# Altium footprint library CADTchip.PcbLib: 195 footprints (part 5 of 13)
Each footprint in its own frame and in the unit in brackets; x right, y up, seen from the top. Pads: shape width x height; smd on the part's side, far side on the other; paste and mask are expansions set on the pad; w line width, h text height; cw(c..) or ccw(c..) is an arc to the next point about the centre after c.
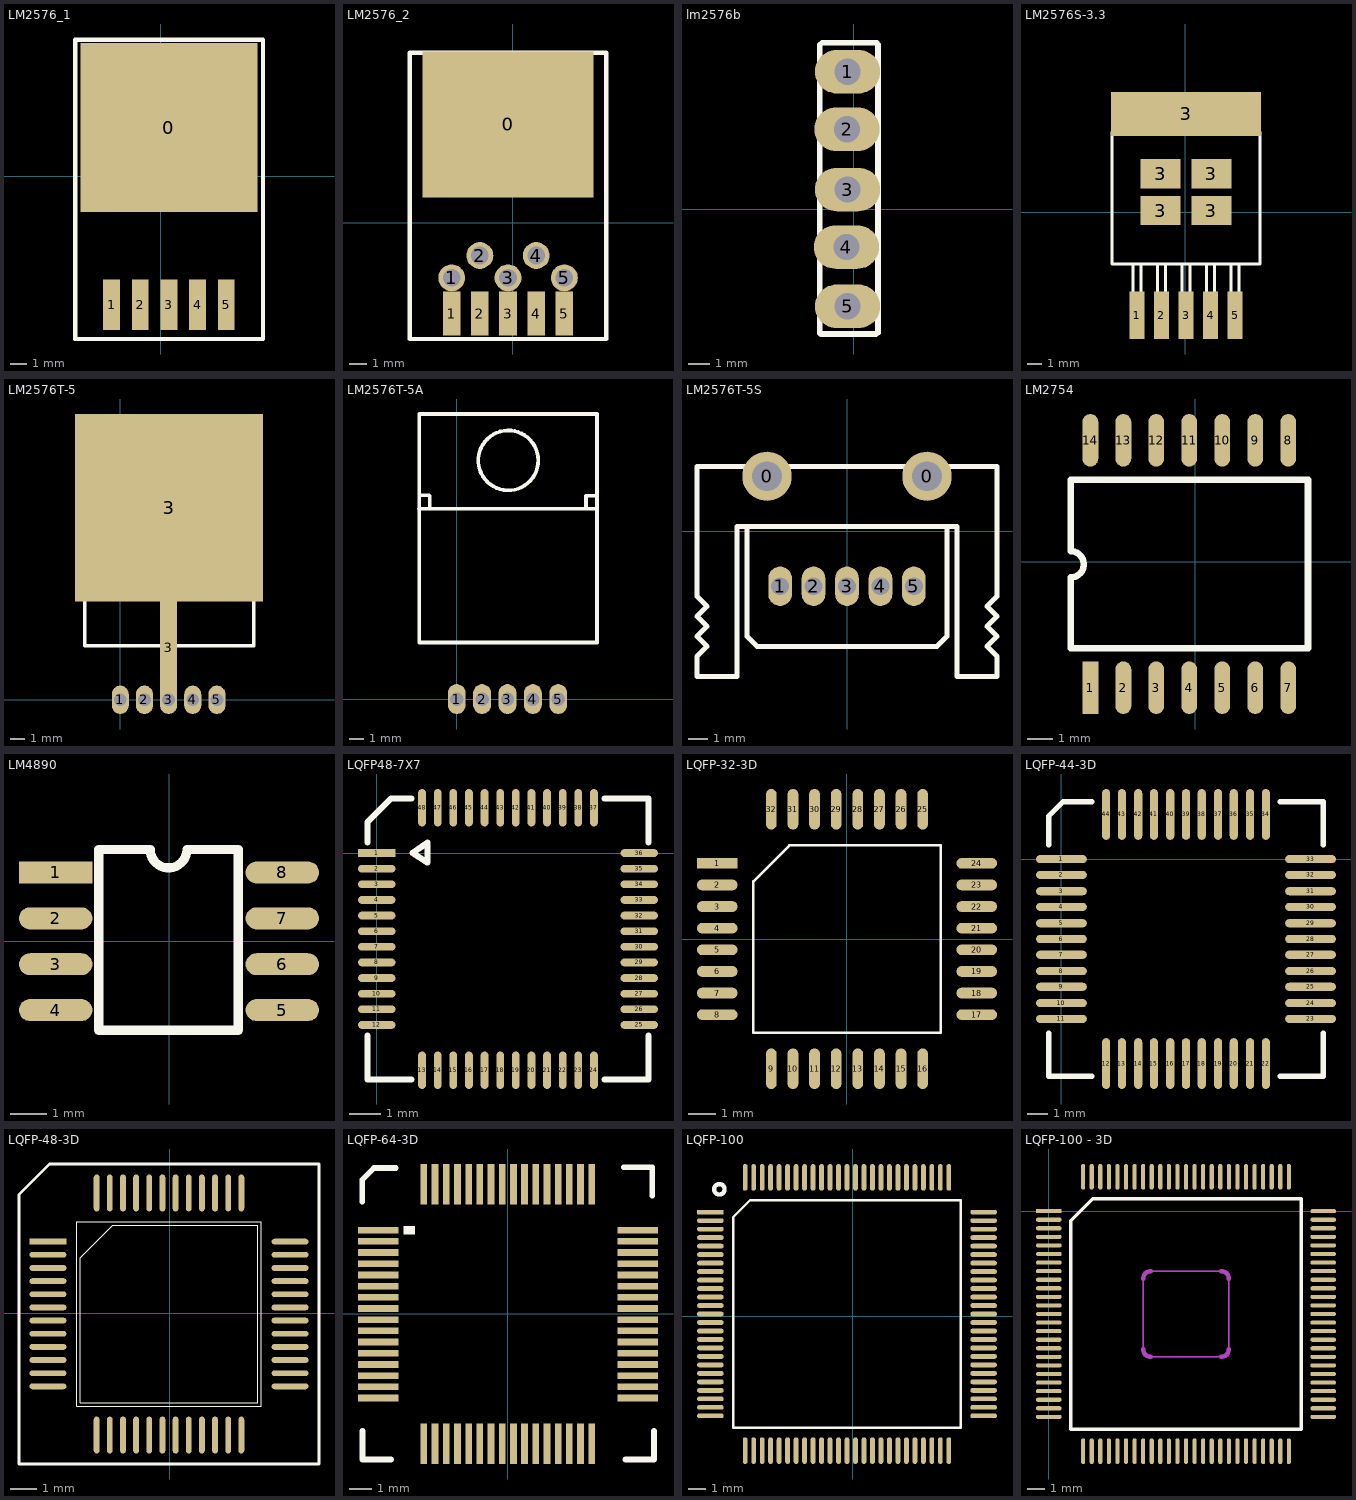
[diagram p4: the footprints below, top view; thin cyan lines are the x and y axes]

## LM2576_1 [mm]
pads (6):
  rect 10.5x10 smd: 0(0.488,2.9)
  rect 1x3 smd: 1(-2.912,-7.6) 2(-1.212,-7.6) 3(0.488,-7.6) 4(2.188,-7.6) 5(3.888,-7.6)
Top Overlay:
  lines w0.254: -5.08,-9.632 -5.061,-9.613 -5.061,8.112 ; -5.08,8.112 6.065,8.112 ; -5.061,-9.632 6.051,-9.632 ; 6.058,-9.625 6.058,8.112

## LM2576_2 [mm]
pads (11):
  rect 9.7x8.3 smd: 0(-0.273,5.581)
  rect 1x2.5 smd: 1(-3.472,-5.163) 2(-1.872,-5.163) 3(-0.272,-5.163) 4(1.329,-5.163) 5(2.929,-5.163)
  round 1.524 hole 1: 1(-3.472,-3.139) 2(-1.872,-1.869) 3(-0.272,-3.139) 4(1.329,-1.869) 5(2.929,-3.139)
Top Overlay:
  lines w0.254: -5.861,-6.611 -5.861,9.137 -5.861,9.645 5.315,9.645 5.315,-6.611 -5.861,-6.611

## lm2576b [mm]
pads (5):
  oval 3x2 hole 1.2: 1(-0.291,6.319) 2(-0.316,3.678) 3(-0.291,0.909) 4(-0.341,-1.732) 5(-0.291,-4.45)
Top Overlay:
  lines w0.254: -1.561,-5.695 -1.561,7.564 ; -1.51,-5.72 1.01,-5.72 ; -1.454,7.64 1.056,7.64 ; 1.106,-5.669 1.106,7.564

## LM2576S-3.3 [mil]
pads (10):
  rect 40x130 smd: 1(-132.5,-280.94) 2(-65.5,-280.94) 3(1.5,-280.94) 4(68.5,-280.94) 5(135.5,-280.94)
  rect 110x80 smd: 3(-68,106.06) 3(-68,5.06) 3(71,5.06) 3(71,106.06)
  rect 410x120 smd: 3(1.5,269.06)
Top Overlay:
  lines w7.87: -143,-218.94 -143,-140.94 ; -122,-218.94 -122,-140.94 ; -76,-218.94 -76,-140.94 ; -55,-218.94 -55,-140.94 ; -9,-218.94 -9,-140.94 ; 12,-218.94 12,-140.94 ; 58,-218.94 58,-140.94 ; 79,-218.94 79,-140.94 ; 125,-218.94 125,-140.94 ; 146,-218.94 146,-140.94 ; -201,-140.94 204,-140.94 204,219.06 -201,219.06 -201,-140.94

## LM2576T-5 [mm]
pads (7):
  oval 1.2x2 hole 0.9: 1(0,0) 2(1.7,0) 3(3.4,0) 4(5.1,0) 5(6.8,0)
  rect 1.2x8 smd: 3(3.404,3.658)
  rect 13.208x13.208 smd: 3(3.429,13.513)
Top Overlay:
  circle w0.254: c3.452,15.987 r2.007
  lines w0.254: -2.517,12.745 9.378,12.745 9.387,12.735 ; -2.513,13.65 -1.857,13.65 ; -1.831,13.624 -1.857,13.65 ; -1.806,12.745 -1.806,13.599 -1.857,13.65 ; 8.659,12.745 8.659,13.624 9.387,13.624 ; -2.513,3.795 -2.513,19.095 9.387,19.095 9.387,3.795 -2.513,3.795

## LM2576T-5A [mm]
pads (5):
  oval 1.2x2 hole 0.9: 1(0,0) 2(1.7,0) 3(3.4,0) 4(5.1,0) 5(6.8,0)
Top Overlay:
  circle w0.254: c3.452,15.987 r2.007
  lines w0.254: -2.517,12.745 9.378,12.745 9.387,12.735 ; -2.513,13.65 -1.857,13.65 ; -1.831,13.624 -1.857,13.65 ; -1.806,12.745 -1.806,13.599 -1.857,13.65 ; 8.659,12.745 8.659,13.624 9.387,13.624 ; -2.513,3.795 9.387,3.795 9.387,19.095 -2.513,19.095 -2.513,3.795

## LM2576T-5S [mm]
pads (7):
  round 2.5 hole 1.5: 0(-4.064,2.794) 0(4.064,2.794)
  oval 1.2x2 hole 0.9: 1(-3.4,-2.794) 2(-1.7,-2.794) 3(0,-2.794) 4(1.7,-2.794) 5(3.4,-2.794)
Top Overlay:
  lines w0.254: -5.08,0.254 -5.08,-0.254 -5.08,-5.334 -4.572,-5.842 4.572,-5.842 5.08,-5.334 5.08,-0.254 5.08,0.254 ; -7.62,-7.366 -5.588,-7.366 -5.588,0.254 5.588,0.254 5.588,-7.366 7.62,-7.366 7.62,-6.35 7.112,-5.842 7.62,-5.334 7.112,-4.826 7.62,-4.318 7.112,-3.81 7.62,-3.302 7.62,3.302 -7.62,3.302 -7.62,-3.302 -7.112,-3.81 -7.62,-4.318 -7.112,-4.826 -7.62,-5.334 -7.112,-5.842 -7.62,-6.35 -7.62,-7.366

## LM2754 [mil]
pads (14):
  rect 24x80 smd: 1(-159,-191)
  oval 24x80 smd: 2(-109,-191) 3(-59,-191) 4(-9,-191) 5(41,-191) 6(91,-191) 7(141,-191) 8(141,184) 9(91,184) 10(41,184) 11(-9,184) 12(-59,184) 13(-109,184) 14(-159,184)
Top Overlay:
  lines w10: -189,-131 -189,-24 ccw(c-189,-4) -189,16 -189,124 171,124 171,-131 -189,-131

## LM4890 [mil]
pads (8):
  rect 80x24 smd: 1(-124,75)
  oval 80x24 smd: 2(-124,25) 3(-124,-25) 4(-124,-75) 5(123,-75) 6(123,-25) 7(123,25) 8(123,75)
Top Overlay:
  lines w10: -77,-97 -77,100 ; -75,-97 73,-97 ; -75,100 -21,100 ccw(c-1,100) 19,100 73,100 ; 75,-97 75,100
3D body: height -15, standoff -81.93, extent -118.11,-96 118.11,96.91

## LQFP48-7X7 [mm]
height 1.2
pads (48):
  rect 1.2x0.25 smd: 1(0,0)
  oval 1.2x0.25 smd: 2(0,-0.5) 3(0,-1) 4(0,-1.5) 5(0,-2) 6(0,-2.5) 7(0,-3) 8(0,-3.5) 9(0,-4) 10(0,-4.5) 11(0,-5) 12(0,-5.5) 25(8.4,-5.5) 26(8.4,-5) 27(8.4,-4.5) 28(8.4,-4) 29(8.4,-3.5) 30(8.4,-3) 31(8.4,-2.5) 32(8.4,-2) 33(8.4,-1.5) 34(8.4,-1) 35(8.4,-0.5) 36(8.4,0)
  oval 0.25x1.2 smd: 13(1.45,-6.95) 14(1.95,-6.95) 15(2.45,-6.95) 16(2.95,-6.95) 17(3.45,-6.95) 18(3.95,-6.95) 19(4.45,-6.95) 20(4.95,-6.95) 21(5.45,-6.95) 22(5.95,-6.95) 23(6.45,-6.95) 24(6.95,-6.95) 37(6.95,1.45) 38(6.45,1.45) 39(5.95,1.45) 40(5.45,1.45) 41(4.95,1.45) 42(4.45,1.45) 43(3.95,1.45) 44(3.45,1.45) 45(2.95,1.45) 46(2.45,1.45) 47(1.95,1.45) 48(1.45,1.45)
Top Overlay:
  lines w0.2: -0.3,-5.842 -0.3,-7.25 1.108,-7.25 ; -0.3,0.342 -0.3,0.993 0.457,1.75 1.108,1.75 ; 7.292,-7.25 8.7,-7.25 8.7,-5.842 ; 7.292,1.75 8.7,1.75 8.7,0.342 ; 1.143,0 1.626,0.33 1.626,-0.305 1.143,0
3D body: height 1.45, standoff 0, extent -0.284,-7.247 8.716,1.753

## LQFP-32-3D [mm]
pads (32):
  rect 1.5x0.4 smd: 1(-4.8,2.8)
  oval 1.5x0.4 smd: 2(-4.8,2) 3(-4.8,1.2) 4(-4.8,0.4) 5(-4.8,-0.4) 6(-4.8,-1.2) 7(-4.8,-2) 8(-4.8,-2.8) 17(4.8,-2.8) 18(4.8,-2) 19(4.8,-1.2) 20(4.8,-0.4) 21(4.8,0.4) 22(4.8,1.2) 23(4.8,2) 24(4.8,2.8)
  oval 0.4x1.5 smd: 9(-2.8,-4.8) 10(-2,-4.8) 11(-1.2,-4.8) 12(-0.4,-4.8) 13(0.4,-4.8) 14(1.2,-4.8) 15(2,-4.8) 16(2.8,-4.8) 25(2.8,4.8) 26(2,4.8) 27(1.2,4.8) 28(0.4,4.8) 29(-0.4,4.8) 30(-1.2,4.8) 31(-2,4.8) 32(-2.8,4.8)
Top Overlay:
  lines w0.1: -3.465,-3.465 3.465,-3.465 3.465,3.465 -2.13,3.465 -3.465,2.13 -3.465,-3.465
3D body: height 1.6, standoff -0.05, extent -4.495,-4.494 4.505,4.506

## LQFP-44-3D [mil]
pads (44):
  oval 100x16 smd: 1(0,0) 2(0,-31) 3(0,-63) 4(0,-94) 5(0,-126) 6(0,-157) 7(0,-188) 8(0,-220) 9(0,-251) 10(0,-283) 11(0,-314) 23(490,-314) 24(490,-283) 25(490,-251) 26(490,-220) 27(490,-188) 28(490,-157) 29(490,-126) 30(490,-94) 31(490,-63) 32(490,-31) 33(490,0)
  oval 16x100 smd: 12(88,-402) 13(119,-402) 14(151,-402) 15(182,-402) 16(214,-402) 17(245,-402) 18(276,-402) 19(308,-402) 20(339,-402) 21(371,-402) 22(402,-402) 34(402,88) 35(371,88) 36(339,88) 37(308,88) 38(276,88) 39(245,88) 40(214,88) 41(182,88) 42(151,88) 43(119,88) 44(88,88)
Top Overlay:
  lines w10: -25,-342 -25,-427 60,-427 ; -25,28 -25,85 3,113 60,113 ; 430,-427 515,-427 515,-342 ; 430,113 515,113 515,28
3D body: height 43.31, standoff -0.39, extent 9.56,-393.22 482,79.22

## LQFP-48-3D [mm]
height 1
pads (48):
  rect 1.4x0.22 smd: 1(-4.625,2.725)
  oval 1.4x0.22 smd: 2(-4.625,2.225) 3(-4.625,1.725) 4(-4.625,1.225) 5(-4.625,0.725) 6(-4.625,0.225) 7(-4.625,-0.275) 8(-4.625,-0.775) 9(-4.625,-1.275) 10(-4.625,-1.775) 11(-4.625,-2.275) 12(-4.625,-2.775) 25(4.575,-2.775) 26(4.575,-2.275) 27(4.575,-1.775) 28(4.575,-1.275) 29(4.575,-0.775) 30(4.575,-0.275) 31(4.575,0.225) 32(4.575,0.725) 33(4.575,1.225) 34(4.575,1.725) 35(4.575,2.225) 36(4.575,2.725)
  oval 0.22x1.4 smd: 13(-2.775,-4.625) 14(-2.275,-4.625) 15(-1.775,-4.625) 16(-1.275,-4.625) 17(-0.775,-4.625) 18(-0.275,-4.625) 19(0.225,-4.625) 20(0.725,-4.625) 21(1.225,-4.625) 22(1.725,-4.625) 23(2.225,-4.625) 24(2.725,-4.625) 37(2.725,4.575) 38(2.225,4.575) 39(1.725,4.575) 40(1.225,4.575) 41(0.725,4.575) 42(0.225,4.575) 43(-0.275,4.575) 44(-0.775,4.575) 45(-1.275,4.575) 46(-1.775,4.575) 47(-2.275,4.575) 48(-2.775,4.575)
Top Overlay:
  lines w0.025: -3.525,-3.525 3.475,-3.525 3.475,3.475 -3.525,3.475 -3.525,3.4 -3.525,-0.025 -3.525,-3.525 ; -3.39,-3.39 -3.39,2.105 -2.155,3.34 3.34,3.34 3.34,-3.39 -3.39,-3.39
  lines w0.102: -5.725,-5.725 5.675,-5.725 5.675,5.675 -4.561,5.675 -5.725,4.511 -5.725,-5.725
3D body: height 1.45, standoff 0, extent -4.523,-4.529 4.477,4.471

## LQFP-64-3D [mm]
pads (64):
  rect 1.8x0.3 smd: 1(-5.8,3.746) 2(-5.8,3.246) 3(-5.8,2.746) 4(-5.8,2.246) 5(-5.8,1.746) 6(-5.8,1.246) 7(-5.8,0.746) 8(-5.8,0.246) 9(-5.8,-0.254) 10(-5.8,-0.754) 11(-5.8,-1.254) 12(-5.8,-1.754) 13(-5.8,-2.254) 14(-5.8,-2.754) 15(-5.8,-3.254) 16(-5.8,-3.754) 33(5.8,-3.754) 34(5.8,-3.254) 35(5.8,-2.754) 36(5.8,-2.254) 37(5.8,-1.754) 38(5.8,-1.254) 39(5.8,-0.754) 40(5.8,-0.254) 41(5.8,0.246) 42(5.8,0.746) 43(5.8,1.246) 44(5.8,1.746) 45(5.8,2.246) 46(5.8,2.746) 47(5.8,3.246) 48(5.8,3.746)
  rect 0.3x1.8 smd: 17(-3.759,-5.8) 18(-3.259,-5.8) 19(-2.759,-5.8) 20(-2.259,-5.8) 21(-1.759,-5.8) 22(-1.259,-5.8) 23(-0.759,-5.8) 24(-0.259,-5.8) 25(0.241,-5.8) 26(0.741,-5.8) 27(1.241,-5.8) 28(1.741,-5.8) 29(2.241,-5.8) 30(2.741,-5.8) 31(3.241,-5.8) 32(3.741,-5.8) 49(3.741,5.8) 50(3.241,5.8) 51(2.741,5.8) 52(2.241,5.8) 53(1.741,5.8) 54(1.241,5.8) 55(0.741,5.8) 56(0.241,5.8) 57(-0.259,5.8) 58(-0.759,5.8) 59(-1.259,5.8) 60(-1.759,5.8) 61(-2.259,5.8) 62(-2.759,5.8) 63(-3.259,5.8) 64(-3.759,5.8)
Top Overlay:
  rectangle: -4.658,3.55 -4.151,3.931
  lines w0.254: -6.517,5.017 -6.517,5.992 -5.984,6.525 -5.009,6.525 ; -6.502,-5.225 -6.502,-6.5 -5.227,-6.5 ; 5.166,6.553 6.441,6.553 6.441,5.278 ; 5.248,-6.5 6.523,-6.5 6.523,-5.225
3D body: height 1.58, standoff 0, extent -6.535,-6.53 6.515,6.521

## LQFP-100 [mil]
pads (100):
  rect 62x11.02 smd: 1(-330,241)
  oval 62x11.02 smd: 2(-330,221.31) 3(-330,201.63) 4(-330,181.94) 5(-330,162.26) 6(-330,142.57) 7(-330,122.89) 8(-330,103.2) 9(-330,83.52) 10(-330,63.84) 11(-330,44.15) 12(-330,24.46) 13(-330,4.78) 14(-330,-14.9) 15(-330,-34.59) 16(-330,-54.27) 17(-330,-73.96) 18(-330,-93.64) 19(-330,-113.33) 20(-330,-133.01) 21(-330,-152.7) 22(-330,-172.38) 23(-330,-192.07) 24(-330,-211.75) 25(-330,-231.44) 51(303.87,-231.44) 52(303.87,-211.75) 53(303.87,-192.07) 54(303.87,-172.38) 55(303.87,-152.7) 56(303.87,-133.01) 57(303.87,-113.33) 58(303.87,-93.64) 59(303.87,-73.96) 60(303.87,-54.27) 61(303.87,-34.59) 62(303.87,-14.9) 63(303.87,4.78) 64(303.87,24.46) 65(303.87,44.15) 66(303.87,63.84) 67(303.87,83.52) 68(303.87,103.2) 69(303.87,122.89) 70(303.87,142.57) 71(303.87,162.26) 72(303.87,181.94) 73(303.87,201.63) 74(303.87,221.31) 75(303.87,241)
  oval 11.02x62 smd: 26(-249.28,-312.16) 27(-229.6,-312.16) 28(-209.91,-312.16) 29(-190.23,-312.16) 30(-170.54,-312.16) 31(-150.86,-312.16) 32(-131.17,-312.16) 33(-111.49,-312.16) 34(-91.8,-312.16) 35(-72.12,-312.16) 36(-52.43,-312.16) 37(-32.75,-312.16) 38(-13.06,-312.16) 39(6.62,-312.16) 40(26.31,-312.16) 41(45.99,-312.16) 42(65.68,-312.16) 43(85.36,-312.16) 44(105.05,-312.16) 45(124.73,-312.16) 46(144.42,-312.16) 47(164.1,-312.16) 48(183.79,-312.16) 49(203.47,-312.16) 50(223.16,-312.16) 76(223.16,321.72) 77(203.47,321.72) 78(183.79,321.72) 79(164.1,321.72) 80(144.42,321.72) 81(124.73,321.72) 82(105.05,321.72) 83(85.36,321.72) 84(65.68,321.72) 85(45.99,321.72) 86(26.31,321.72) 87(6.62,321.72) 88(-13.06,321.72) 89(-32.75,321.72) 90(-52.43,321.72) 91(-72.12,321.72) 92(-91.8,321.72) 93(-111.49,321.72) 94(-131.17,321.72) 95(-150.86,321.72) 96(-170.54,321.72) 97(-190.23,321.72) 98(-209.91,321.72) 99(-229.6,321.72) 100(-249.28,321.72)
Top Overlay:
  circle w10: c-309.17,294 r12.16
  lines w5.91: -277.24,-259.39 -277.24,229.19 -237.47,268.95 251.11,268.95 251.11,-259.39 -277.24,-259.39

## LQFP-100 - 3D [mm]
pads (100):
  rect 1.5x0.24 smd: 1(0,0)
  oval 1.5x0.24 smd: 2(0,-0.5) 3(0,-1) 4(0,-1.5) 5(0,-2) 6(0,-2.5) 7(0,-3) 8(0,-3.5) 9(0,-4) 10(0,-4.5) 11(0,-5) 12(0,-5.5) 13(0,-6) 14(0,-6.5) 15(0,-7) 16(0,-7.5) 17(0,-8) 18(0,-8.5) 19(0,-9) 20(0,-9.5) 21(0,-10) 22(0,-10.5) 23(0,-11) 24(0,-11.5) 25(0,-12) 51(16,-12) 52(16,-11.5) 53(16,-11) 54(16,-10.5) 55(16,-10) 56(16,-9.5) 57(16,-9) 58(16,-8.5) 59(16,-8) 60(16,-7.5) 61(16,-7) 62(16,-6.5) 63(16,-6) 64(16,-5.5) 65(16,-5) 66(16,-4.5) 67(16,-4) 68(16,-3.5) 69(16,-3) 70(16,-2.5) 71(16,-2) 72(16,-1.5) 73(16,-1) 74(16,-0.5) 75(16,0)
  oval 0.24x1.5 smd: 26(2,-14) 27(2.5,-14) 28(3,-14) 29(3.5,-14) 30(4,-14) 31(4.5,-14) 32(5,-14) 33(5.5,-14) 34(6,-14) 35(6.5,-14) 36(7,-14) 37(7.5,-14) 38(8,-14) 39(8.5,-14) 40(9,-14) 41(9.5,-14) 42(10,-14) 43(10.5,-14) 44(11,-14) 45(11.5,-14) 46(12,-14) 47(12.5,-14) 48(13,-14) 49(13.5,-14) 50(14,-14) 76(14,2) 77(13.5,2) 78(13,2) 79(12.5,2) 80(12,2) 81(11.5,2) 82(11,2) 83(10.5,2) 84(10,2) 85(9.5,2) 86(9,2) 87(8.5,2) 88(8,2) 89(7.5,2) 90(7,2) 91(6.5,2) 92(6,2) 93(5.5,2) 94(5,2) 95(4.5,2) 96(4,2) 97(3.5,2) 98(3,2) 99(2.5,2) 100(2,2)
Top Overlay:
  lines w0.2: 1.285,-12.715 1.285,-0.57 2.57,0.715 14.715,0.715 14.715,-12.715 1.285,-12.715
Keep-Out Layer:
  lines w0.1: 5.5,-8.05 5.5,-3.95 ; 5.95,-8.5 10.05,-8.5 ; 5.95,-3.5 10.05,-3.5 ; 10.5,-8.05 10.5,-3.95
  lines w0.254: 5.5,-8.05 ccw(c5.95,-8.05) 5.95,-8.5 ; 5.5,-3.95 cw(c5.95,-3.95) 5.95,-3.5 ; 10.05,-8.5 ccw(c10.05,-8.05) 10.5,-8.05 ; 10.05,-3.5 cw(c10.05,-3.95) 10.5,-3.95
Mechanical 1:
  lines w0.1: 5.5,-8.05 5.5,-3.95 ; 5.95,-8.5 10.05,-8.5 ; 5.95,-3.5 10.05,-3.5 ; 10.5,-8.05 10.5,-3.95
  lines w0.254: 5.5,-8.05 ccw(c5.95,-8.05) 5.95,-8.5 ; 5.5,-3.95 cw(c5.95,-3.95) 5.95,-3.5 ; 10.05,-8.5 ccw(c10.05,-8.05) 10.5,-8.05 ; 10.05,-3.5 cw(c10.05,-3.95) 10.5,-3.95
3D body: height 1.61, standoff -0.01, extent 0,-13.993 16,2.007